# Altium footprint library Connector.PcbLib: 114 footprints (part 8 of 8)
Each footprint in its own frame and in the unit in brackets; x right, y up, seen from the top. Pads: shape width x height; smd on the part's side, far side on the other; paste and mask are expansions set on the pad; w line width, h text height; cw(c..) or ccw(c..) is an arc to the next point about the centre after c.
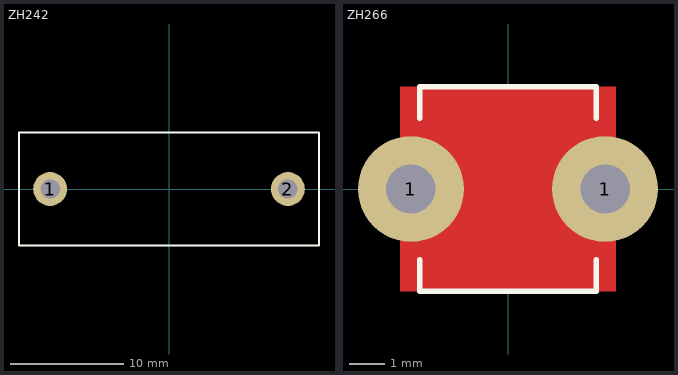
[diagram p7: the footprints below, top view; thin cyan lines are the x and y axes]

## ZH242 [mm]
pads (2):
  round 3 hole 1.7: 1(-10.5,0) 2(10.5,0)
Top Overlay:
  lines w0.2: -13.25,-5 13.25,-5 13.25,5 -13.25,5 -13.25,-5
3D body "ZH242.STEP": height 13.41, standoff -2.99, extent -13.25,-4.9 13.25,4.9

## ZH266 [mm]
pads (2):
  round 3 hole 1.4: 1(-2.75,0) 1(2.75,0)
Top Layer:
  region: -2.3,2.5 -2.3,-2.5 2.3,-2.5 2.3,2.5
  pour cut-out: -3.05,2.9 -3.05,-2.9 3.05,-2.9 3.05,2.9
Bottom Layer:
  region: -2.75,1.5 2.75,1.5 2.75,-1.5 -2.75,-1.5
Top Overlay:
  lines w0.15: -2.5,-2 -2.5,-2.9 2.5,-2.9 2.5,-2 ; -2.5,2 -2.5,2.9 2.5,2.9 2.5,2
Top Solder:
  region: -2.3,2.5 -2.3,-2.5 2.3,-2.5 2.3,2.5
3D body "ZH266.STEP": height 8.28, standoff -3.99, extent -3.05,-2.9 3.05,2.9